# Altium footprint library Toi Library.PcbLib: 740 footprints (part 16 of 47)
Each footprint in its own frame and in the unit in brackets; x right, y up, seen from the top. Pads: shape width x height; smd on the part's side, far side on the other; paste and mask are expansions set on the pad; w line width, h text height; cw(c..) or ccw(c..) is an arc to the next point about the centre after c.
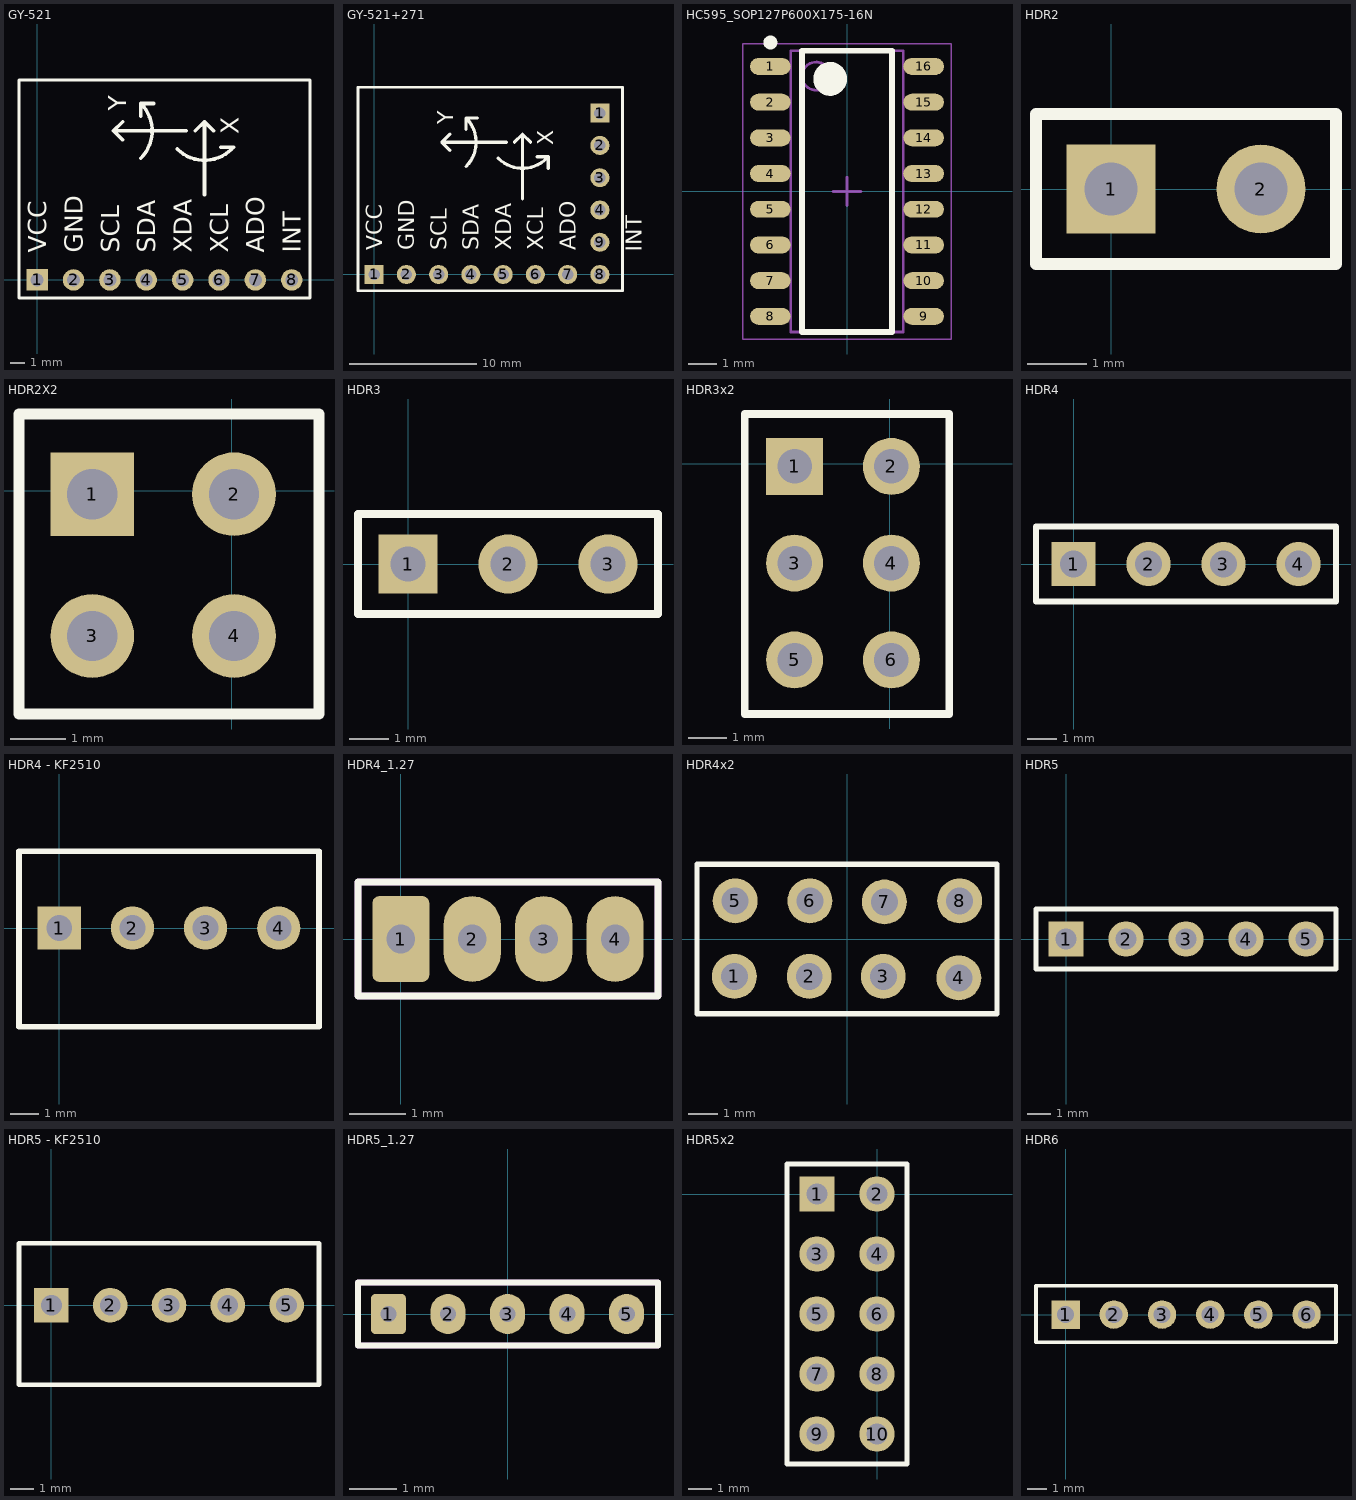
[diagram p15: the footprints below, top view; thin cyan lines are the x and y axes]

## GY-521 [mm] "Connector; Header; 8 Position"
height 1.14
pads (8):
  rect 1.5x1.5 hole 0.9: 1(0,0)
  round 1.5 hole 0.9: 2(2.54,0) 3(5.08,0) 4(7.62,0) 5(10.16,0) 6(12.7,0) 7(15.24,0) 8(17.78,0)
Top Overlay:
  lines w0.2: -1.27,-1.27 -1.27,13.97 19.05,13.97 19.05,-1.27 -1.27,-1.27
  lines w0.254: 5.969,9.779 5.334,10.414 ; 5.969,11.049 5.334,10.414 ; 7.239,8.509 ccw(c5.334,10.414) 7.239,12.319 ; 7.239,11.421 7.239,12.319 ; 8.137,12.319 7.239,12.319 ; 9.779,9.144 ccw(c11.684,11.049) 13.589,9.144 ; 10.414,10.414 5.334,10.414 ; 11.049,10.414 11.684,11.049 ; 11.684,5.969 11.684,11.049 ; 12.319,10.414 11.684,11.049 ; 12.818,9.271 13.716,9.271
  text "Y" at 6.223,11.811 h1.27
  text "X" at 14.097,10.16 h1.27
  text "INT" at 18.415,1.905 h1.27
  text "ADO" at 15.875,1.905 h1.27
  text "XCL" at 13.335,1.905 h1.27
  text "XDA" at 10.795,1.905 h1.27
  text "SDA" at 8.255,1.905 h1.27
  text "SCL" at 5.715,1.905 h1.27
  text "GND" at 3.175,1.905 h1.27
  text "VCC" at 0.635,1.905 h1.27
3D body "female_header_a-bl254-eg-g08d.stp": height 7.92, standoff -3.78, extent -1.395,-1.257 19.175,1.243
3D body "User Library-GY-521.STEP": height 11.93, standoff 0.11, extent -1.27,-1.257 19.05,13.988

## GY-521+271 [mm] "Connector; Header; 8 Position"
height 1.14
pads (13):
  rect 1.5x1.5 hole 0.9: 1(0,0) 1(17.78,12.7)
  round 1.5 hole 0.9: 2(2.54,0) 2(17.78,10.16) 3(5.08,0) 3(17.78,7.62) 4(7.62,0) 4(17.78,5.08) 5(10.16,0) 6(12.7,0) 7(15.24,0) 8(17.78,0) 9(17.78,2.54)
Top Overlay:
  lines w0.2: -1.27,-1.27 -1.27,14.732 19.558,14.732 19.558,-1.27 -1.27,-1.27
  lines w0.254: 5.969,9.779 5.334,10.414 ; 5.969,11.049 5.334,10.414 ; 7.239,8.509 ccw(c5.334,10.414) 7.239,12.319 ; 7.239,11.421 7.239,12.319 ; 8.137,12.319 7.239,12.319 ; 9.779,9.144 ccw(c11.684,11.049) 13.589,9.144 ; 10.414,10.414 5.334,10.414 ; 11.049,10.414 11.684,11.049 ; 11.684,5.969 11.684,11.049 ; 12.319,10.414 11.684,11.049 ; 12.818,9.271 13.716,9.271 13.716,8.373
  text "Y" at 6.223,11.811 h1.27
  text "X" at 14.097,10.16 h1.27
  text "INT" at 21.082,1.778 h1.27
  text "ADO" at 15.875,1.905 h1.27
  text "XCL" at 13.335,1.905 h1.27
  text "XDA" at 10.795,1.905 h1.27
  text "SDA" at 8.255,1.905 h1.27
  text "SCL" at 5.715,1.905 h1.27
  text "GND" at 3.175,1.905 h1.27
  text "VCC" at 0.635,1.905 h1.27
Bottom Overlay:
  lines w0.2: 1.397,1.27 1.397,14.605 19.431,14.605 19.431,1.27 1.397,1.27
  lines w0.254: 3.81,6.985 3.175,7.62 ; 3.81,8.255 3.175,7.62 ; 7.747,12.065 8.255,12.573 ; 8.763,12.065 8.255,12.573 ; 3.175,7.62 8.255,7.62 8.255,12.573
  text "Z" at 8.763,7.62 h1.02
  text "X" at 6.477,11.557 h1.02
  text "Y" at 4.064,8.382 h1.02
  text "DRDY" at 10.541,2.032 h1.27
  text "VCC" at 11.811,12.192 h1.27
  text "GND" at 11.811,9.779 h1.27
  text "SCL" at 11.811,7.112 h1.27
  text "SDA" at 11.811,4.953 h1.27
3D body "female_header_a-bl254-eg-g08d.stp": height 7.92, standoff -3.78, extent -1.395,-1.257 19.175,1.243
3D body "User Library-GY-521.STEP": height 11.93, standoff 0.11, extent -1.27,-1.257 19.05,13.988
3D body "female_header_a-bl254-eg-g05d.stp": height 8.52, standoff -3.18, extent 16.523,1.132 19.023,14.082

## HC595_SOP127P600X175-16N [mm] "SOP, 16-Leads, Body 9.90x3.90mm, Pitch 1.27mm, IPC Medium Density"
height 1.75
pads (16):
  oval 1.45x0.6 smd: 1(-2.725,4.445) 2(-2.725,3.175) 3(-2.725,1.905) 4(-2.725,0.635) 5(-2.725,-0.635) 6(-2.725,-1.905) 7(-2.725,-3.175) 8(-2.725,-4.445) 9(2.725,-4.445) 10(2.725,-3.175) 11(2.725,-1.905) 12(2.725,-0.635) 13(2.725,0.635) 14(2.725,1.905) 15(2.725,3.175) 16(2.725,4.445)
Top Overlay:
  circle w0.25: c-2.725,5.295 r0.125
  circle w0.6: c-0.6,4 r0.3
  lines w0.2: -1.6,-5 -1.6,5 1.6,5 1.6,-5 -1.6,-5
Mechanical 13:
  circle w0.1: c-1.1,4.1 r0.5
  lines w0.1: -2,-5 -2,5 2,5 2,-5 -2,-5
Mechanical 15:
  lines w0.05: -3.7,-5.25 -3.7,5.25 3.7,5.25 3.7,-5.25 -3.7,-5.25
  lines w0.1: -0.5,0 0.5,0 ; 0,-0.5 0,0.5
3D body "SOP127P600X175-16N.step": height 1.75, standoff 0, extent -3,-5 3,5

## HDR2 [mm] "Connector; Header; 2 Position"
height 1.14
pads (2):
  rect 1.5x1.5 hole 0.9: 1(0,0)
  round 1.5 hole 0.9: 2(2.54,0)
Top Overlay:
  lines w0.2: -1.27,-1.27 3.81,-1.27 3.81,1.27 -1.27,1.27 -1.27,-1.27
3D body "female_header_a-bl254-eg-g02d.stp": height 7.92, standoff -3.78, extent -1.395,-1.263 3.935,1.237

## HDR2X2 [mm] "Connector; Header; 3x2 Position"
height 1.14
pads (4):
  rect 1.5x1.5 hole 0.9: 1(-2.5,-0.062)
  round 1.5 hole 0.9: 2(0.04,-0.062) 3(-2.5,-2.602) 4(0.04,-2.602)
Top Overlay:
  lines w0.2: -3.812,-4 1.562,-4 1.562,1.375 -3.812,1.375 -3.812,-4
3D body "User Library-Header1x2.STEP": height 1.39, standoff -9.59, extent -3.665,-3.875 1.415,-1.335
3D body "User Library-Header1x2.STEP": height 1.39, standoff -9.59, extent -3.665,-1.312 1.415,1.228

## HDR3 [mm] "Connector; Header; 3 Position"
height 1.14
pads (3):
  rect 1.5x1.5 hole 0.9: 1(0,0)
  round 1.5 hole 0.9: 2(2.54,0) 3(5.08,0)
Top Overlay:
  lines w0.2: -1.27,-1.27 6.35,-1.27 6.35,1.27 -1.27,1.27 -1.27,-1.27
3D body "female_header_a-bl254-eg-g03d.stp": height 5.12, standoff -6.58, extent -1.395,-1.25 6.475,1.25

## HDR3x2 [mm] "Connector; Header; 3x2 Position"
height 1.14
pads (6):
  rect 1.5x1.5 hole 0.9: 1(-2.5,-0.062)
  round 1.5 hole 0.9: 2(0.04,-0.062) 3(-2.5,-2.602) 4(0.04,-2.602) 5(-2.5,-5.142) 6(0.04,-5.142)
Top Overlay:
  lines w0.2: -3.812,-6.562 1.562,-6.562 1.562,1.312 -3.812,1.312 -3.812,-6.562
3D body "User Library-Header1x2.STEP": height 1.39, standoff -9.59, extent -3.665,-6.438 1.415,-3.898
3D body "User Library-Header1x2.STEP": height 1.39, standoff -9.59, extent -3.665,-3.875 1.415,-1.335
3D body "User Library-Header1x2.STEP": height 1.39, standoff -9.59, extent -3.665,-1.312 1.415,1.228

## HDR4 [mm] "Connector; Header; 4 Position"
height 1.14
pads (4):
  rect 1.5x1.5 hole 0.9: 1(0,0)
  round 1.5 hole 0.9: 2(2.54,0) 3(5.08,0) 4(7.62,0)
Top Overlay:
  lines w0.2: -1.27,-1.27 8.89,-1.27 8.89,1.27 -1.27,1.27 -1.27,-1.27
3D body "female_header_a-bl254-eg-g04d.stp": height 3.22, standoff -8.48, extent -1.382,-1.217 9.028,1.283

## HDR4 - KF2510 [mm] "Connector; Header; 4 Position"
height 1.14
pads (4):
  rect 1.5x1.5 hole 0.9: 1(0,0)
  round 1.5 hole 0.9: 2(2.54,0) 3(5.08,0) 4(7.62,0)
Top Overlay:
  lines w0.2: -1.397,-3.429 9.017,-3.429 9.017,2.667 -1.397,2.667 -1.397,-3.429
3D body "User Library-CI31_4.STEP": height 10.53, standoff -4.27, extent -1.27,-3.279 8.89,2.521

## HDR4_1.27 [mil] "Connector; Header; 4 Position, 0.050\" pitch"
pads (4):
  rrect25% 40x60 hole 20: 1(0,0)
  oval 40x60 hole 20: 2(50,0) 3(100,0) 4(150,0)
Top Overlay:
  lines w5: -30,-40 180,-40 180,40 -30,40 -30,-40
Mechanical 13:
  lines w5: -30,-40 180,-40 180,40 -30,40 -30,-40

## HDR4x2 [mil] "Connector 4x2"
height 200
pads (8):
  round 60 hole 36: 1(-150.5,-49.5) 2(-50.5,-49.5) 3(48.5,-49.5) 4(149.5,-51.5) 5(-149.5,51.5) 6(-49.5,51.5) 7(50,50) 8(150.5,51.5)
Top Overlay:
  lines w7: -200.5,-99.5 200.5,-99.5 200.5,100.5 -200.5,100.5 -200.5,0.5 -200.5,-99.5
3D body "JP2-4.stp": height 335.25, standoff -117.51, extent -196.99,-99.99 203.01,100.01

## HDR5 [mm] "Connector; Header; 5 Position"
height 1.14
pads (5):
  rect 1.5x1.5 hole 0.9: 1(0,0)
  round 1.5 hole 0.9: 2(2.54,0) 3(5.08,0) 4(7.62,0) 5(10.16,0)
Top Overlay:
  lines w0.2: -1.27,-1.27 11.43,-1.27 11.43,1.27 -1.27,1.27 -1.27,-1.27
3D body "female_header_a-bl254-eg-g05d.stp": height 8.52, standoff -3.18, extent -1.382,-1.257 11.568,1.243

## HDR5 - KF2510 [mm] "Connector; Header; 5 Position"
height 1.14
pads (5):
  rect 1.5x1.5 hole 0.9: 1(0,0)
  round 1.5 hole 0.9: 2(2.54,0) 3(5.08,0) 4(7.62,0) 5(10.16,0)
Top Overlay:
  lines w0.2: -1.397,-3.429 -1.397,2.667 11.557,2.667 11.557,-3.429 -1.397,-3.429
3D body "User Library-CI31_5_new.STEP": height 10.53, standoff -4.27, extent -1.27,-3.279 11.43,2.521

## HDR5_1.27 [mm] "Programming connector target; 5 Position with minimally sized pads, 0.050\" pitch"
pads (5):
  rrect25% 0.75x0.85 hole 0.35 mask+0.1: 1(-2.54,0)
  oval 0.75x0.85 hole 0.35 mask+0.1: 2(-1.27,0) 3(0,0) 4(1.27,0) 5(2.54,0)
Top Overlay:
  lines w0.127: -3.19,-0.675 -3.19,0.675 3.21,0.675 3.21,-0.675 -3.19,-0.675
Mechanical 13:
  lines w0.127: -3.19,-0.675 -3.19,0.675 3.21,0.675 3.21,-0.675 -3.19,-0.675
3D body: height -0.08, standoff -0.13, extent -3.044,-0.507 -2.032,0.507

## HDR5x2 [mm] "Connector; Header; 3x2 Position"
height 1.14
pads (10):
  rect 1.5x1.5 hole 0.9: 1(-2.54,0)
  round 1.5 hole 0.9: 2(0,0) 3(-2.54,-2.54) 4(0,-2.54) 5(-2.54,-5.08) 6(0,-5.08) 7(-2.54,-7.62) 8(0,-7.62) 9(-2.54,-10.16) 10(0,-10.16)
Top Overlay:
  lines w0.2: -3.81,-11.43 -3.81,1.27 1.27,1.27 1.27,-11.43 -3.81,-11.43
3D body "User Library-Header1x2.STEP": height 1.39, standoff -9.59, extent -3.81,-11.43 1.27,-8.89
3D body "User Library-Header1x2.STEP": height 1.39, standoff -9.59, extent -3.81,-1.27 1.27,1.27
3D body "User Library-Header1x2.STEP": height 1.39, standoff -9.59, extent -3.81,-3.81 1.27,-1.27
3D body "User Library-Header1x2.STEP": height 1.39, standoff -9.59, extent -3.81,-6.35 1.27,-3.81
3D body "User Library-Header1x2.STEP": height 1.39, standoff -9.59, extent -3.81,-8.89 1.27,-6.35

## HDR6 [mm] "Connector; Header; 6 Position"
height 1.14
pads (6):
  rect 1.5x1.5 hole 0.9: 1(0,0)
  round 1.5 hole 0.9: 2(2.54,0) 3(5.08,0) 4(7.62,0) 5(10.16,0) 6(12.7,0)
Top Overlay:
  lines w0.2: -1.565,-1.455 -1.565,1.516 14.254,1.516 14.254,-1.455 -1.565,-1.455
3D body "female_header_a-bl254-eg-g06d.stp": height 7.92, standoff -3.78, extent -1.395,-1.237 14.095,1.263